# Altium footprint library PCB-Tester-Board-V1.PcbLib: 67 footprints (part 4 of 5)
Each footprint in its own frame and in the unit in brackets; x right, y up, seen from the top. Pads: shape width x height; smd on the part's side, far side on the other; paste and mask are expansions set on the pad; w line width, h text height; cw(c..) or ccw(c..) is an arc to the next point about the centre after c.
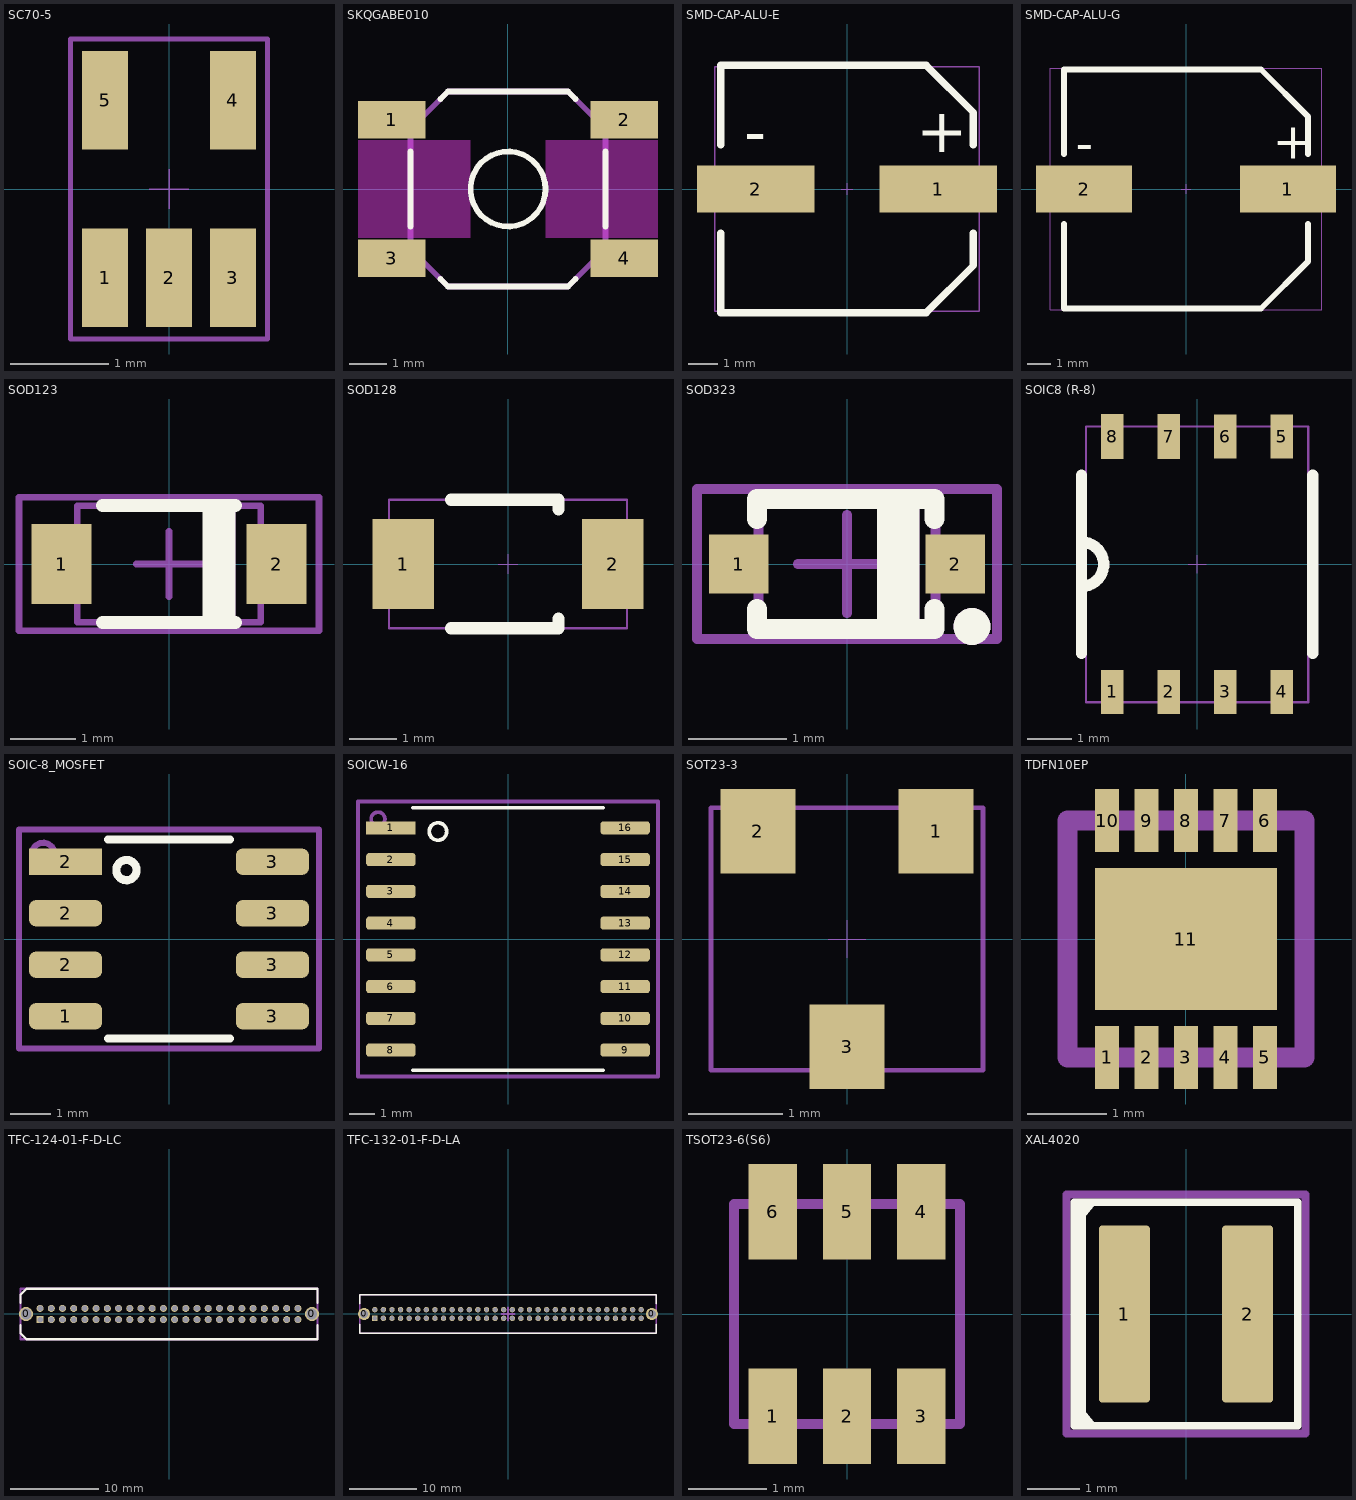
[diagram p3: the footprints below, top view; thin cyan lines are the x and y axes]

## SC70-5 [mm]
pads (5):
  rect 0.47x1 smd: 1(-0.65,-0.9) 2(0,-0.9) 3(0.65,-0.9) 4(0.65,0.9) 5(-0.65,0.9)
Top Courtyard:
  lines w0.05: -1,-1.524 1,-1.524 1,1.524 -1,1.524 -1,-1.524
Mechanical 17:
  lines w0.013: -0.2,0 0.2,0 ; 0,-0.2 0,0.2
3D body "SC70-5.step": height 0.95, standoff 0, extent -1,-1.05 1,1.05

## SKQGABE010 [mm] "5.2mm square low-profile TACT switch"
height 1.5
pads (4):
  rect 1.8x1 smd: 1(-3.1,1.85) 2(3.1,1.85) 3(-3.1,-1.85) 4(3.1,-1.85)
Top Layer keep-out:
  region: -1,1.3 -4,1.3 -4,-1.3 -1,-1.3
  rectangle: 1,-1.3 4,1.3
Top Overlay:
  circle w0.15: c0,0 r1
  lines w0.15: -2.6,-1 -2.6,1 ; -1.8,-2.4 -1.6,-2.6 1.6,-2.6 1.8,-2.4 ; -1.8,2.4 -1.6,2.6 1.6,2.6 1.8,2.4 ; 2.6,-1 2.6,1
Mechanical 15:
  lines w0.15: -2.6,-1.6 -1.6,-2.6 1.6,-2.6 2.6,-1.6 2.6,1.6 1.6,2.6 -1.6,2.6 -2.6,1.6 -2.6,-1.6
3D body: height 1.5, standoff 1.2, extent -0.992,-0.998 1,0.998
3D body: height 1.2, standoff 0, extent -2.6,-2.6 2.6,2.6
3D body: height 0.3, standoff 0, extent 2.1,1.6 3.2,2.1
3D body: height 0.3, standoff 0, extent -3.2,-2.1 -2.1,-1.6
3D body: height 0.3, standoff 0, extent 2.1,-2.1 3.2,-1.6
3D body: height 0.3, standoff 0, extent -3.2,1.6 -2.1,2.1

## SMD-CAP-ALU-E [mm] "Ř8.0mm x 6.2mm"
pads (2):
  rect 4x1.6 smd: 1(3.1,0) 2(-3.1,0)
Top Overlay:
  lines w0.254: -4.3,-1.5 -4.3,-4.2 2.7,-4.2 4.3,-2.6 4.3,-1.5 ; -4.3,1.5 -4.3,4.2 2.7,4.2 4.3,2.6 4.3,1.5
  text "+" at 2.35,1.25 h1.52
  text "-" at -3.5,1.2 h1.52
Top Courtyard:
  lines w0.05: -4.5,-4.15 4.5,-4.15 4.5,4.15 -4.5,4.15 -4.5,-4.15
Mechanical 17:
  lines w0.013: -0.2,0 0.2,0 ; 0,-0.2 0,0.2
3D body "SMD-CAP-ALU-E.STEP": height 6.2, standoff 0, extent -4.5,-4.15 4.5,4.15

## SMD-CAP-ALU-G [mm] "Ř10.0mm x 10.2mm"
pads (2):
  rect 4.1x2 smd: 1(4.35,0) 2(-4.35,0)
Top Overlay:
  lines w0.254: -5.2,-1.5 -5.2,-5.1 3.2,-5.1 5.2,-3.1 5.2,-1.5 ; -5.2,1.5 -5.2,5.1 3.2,5.1 5.2,3.1 5.2,1.5
  text "+" at 3.7,1.3 h1.52
  text "-" at -4.7,1.2 h1.52
Top Courtyard:
  lines w0.05: -5.8,-5.15 5.8,-5.15 5.8,5.15 -5.8,5.15 -5.8,-5.15
Mechanical 17:
  lines w0.013: -0.2,0 0.2,0 ; 0,-0.2 0,0.2
3D body "SMD-CAP-ALU-G.STEP": height 10.2, standoff 0, extent -5.8,-5.15 5.8,5.15

## SOD123 [mil]
pads (2):
  rect 35.98x47.99 smd: 1(-64.5,0) 2(64.5,0)
Top Overlay:
  rectangle: 20,-35 40,35
  lines w7.87: -40,-35 40,-35 ; -40,35 40,35
Mechanical 13:
  rectangle: 25,-35 40,35
  lines w3.94: -55,-35 55,-35 55,35 -55,35 -55,-35
Mechanical 15:
  lines w3.94: -19.68,0 19.68,0 ; 0,-19.68 0,19.68 ; -90,-40 90,-40 90,40 -90,40 -90,-40
3D body: height 47.24, standoff 0, extent -55,-35 55,35

## SOD128 [mm] "PMEG4050EP,115"
pads (2):
  rect 1.3x1.9 smd: 1(-2.2,0) 2(2.2,0)
Top Overlay:
  lines w0.254: -1.2,-1.35 1.06,-1.35 1.06,-1.15 ; -1.2,1.35 1.06,1.35 1.06,1.15
Top Courtyard:
  lines w0.05: -2.5,-1.35 -2.5,1.35 2.5,1.35 2.5,-1.35 -2.5,-1.35
Mechanical 17:
  lines w0.013: -0.2,0 0.2,0 ; 0,-0.2 0,0.2
3D body "Schottky_Diode_SOD128.step": height 1.1, standoff -0.01, extent -2.5,-1.35 2.5,1.35

## SOD323 [mm]
pads (2):
  rect 0.6x0.6 smd: 1(-1.1,0) 2(1.1,0)
Top Overlay:
  circle w0.254: c1.27,-0.635 r0.06
  rectangle: 0.305,-0.635 0.737,0.726
  lines w0.2: -0.914,-0.457 -0.914,-0.66 0.889,-0.66 0.889,-0.457 ; -0.914,0.457 -0.914,0.66 0.889,0.66 0.889,0.457
Mechanical 13:
  circle w0.254: c1.27,-0.635 r0.06
  rectangle: 0.305,-0.686 0.737,0.675
  lines w0.1: -0.9,-0.229 -1.321,-0.229 -1.321,0.229 -0.9,0.229 ; 0.9,-0.229 1.321,-0.229 1.321,0.229 0.9,0.229 ; -0.9,-0.675 -0.9,0.675 0.9,0.675 0.9,-0.675 -0.9,-0.675
Mechanical 15:
  lines w0.1: -0.5,0 0.5,0 ; 0,-0.5 0,0.5 ; -1.524,-0.762 1.524,-0.762 1.524,0.762 -1.524,0.762 -1.524,-0.762
3D body: height 1.1, standoff 0, extent -0.9,-0.675 0.9,0.675

## SOIC8 (R-8) [mil] "Generic 8 lead SOIC Narrow Body"
height 69
pads (8):
  rect 20x39 smd: 1(-75,-113) 2(-25,-113) 3(25,-113) 4(75,-113) 5(75,113) 6(25,113)
  rect 20x40 smd: 7(-25,113) 8(-75,113)
Top Overlay:
  lines w10: -102.36,-78.74 -102.36,78.74 ; -102.36,-19.68 ccw(c-102.36,0) -102.36,19.68 ; 102.36,-78.74 102.36,78.74
Top Courtyard:
  lines w1.97: -98.42,-122.04 98.43,-122.04 98.43,122.06 -98.42,122.06 -98.42,-122.04
Mechanical 17:
  lines w0.51: -7.87,0 7.87,0 ; 0,-7.87 0,7.87
3D body "SOIC8N.step": height 68.9, standoff 0, extent -98.42,-122.04 98.43,122.06

## SOIC-8_MOSFET [mm] "8 lead SOIC with pin numbering for MOSFET"
height 1.75
pads (8):
  rrect50% 1.8x0.65 smd paste+0 mask+0.05: 1(-2.55,-1.905) 2(-2.55,-0.635) 2(-2.55,0.635) 3(2.55,-1.905) 3(2.55,-0.635) 3(2.55,0.635) 3(2.55,1.905)
  rect 1.8x0.65 smd paste+0 mask+0.05: 2(-2.55,1.905)
Top Overlay:
  circle w0.2: c-1.05,1.7 r0.25
  lines w0.2: -1.5,-2.45 1.5,-2.45 ; -1.5,2.45 1.5,2.45
Mechanical 15:
  circle w0.15: c-3.1,2.1 r0.275
  lines w0.15: -3.7,-2.7 3.7,-2.7 3.7,2.7 -3.7,2.7 -3.7,-2.7
3D body: height 1.75, standoff 1.75, extent -1.418,1.481 -0.9,2
3D body: height 0.15, standoff 0, extent -3,1.695 -2.65,2.115
3D body: height 0.15, standoff 0, extent -3,0.425 -2.65,0.845
3D body: height 0.15, standoff 0, extent -3,-0.845 -2.65,-0.425
3D body: height 0.15, standoff 0, extent -3,-2.115 -2.65,-1.695
3D body: height 0.15, standoff 0, extent 2.65,1.695 3,2.115
3D body: height 0.15, standoff 0, extent 2.65,0.425 3,0.845
3D body: height 0.15, standoff 0, extent 2.65,-0.845 3,-0.425
3D body: height 0.15, standoff 0, extent 2.65,-2.115 3,-1.695
3D body: height 1.75, standoff 0, extent -1.95,-2.45 1.95,2.45
3D body: height 0.87, standoff 0, extent -2.65,-0.845 -1.95,-0.425
3D body: height 0.87, standoff 0, extent -2.65,0.425 -1.95,0.845
3D body: height 0.87, standoff 0, extent -2.65,1.695 -1.95,2.115
3D body: height 0.87, standoff 0, extent -2.65,-2.115 -1.95,-1.695
3D body: height 0.87, standoff 0, extent 1.95,-2.115 2.65,-1.695
3D body: height 0.87, standoff 0, extent 1.95,-0.845 2.65,-0.425
3D body: height 0.87, standoff 0, extent 1.95,0.425 2.65,0.845
3D body: height 0.87, standoff 0, extent 1.95,1.695 2.65,2.115

## SOICW-16 [mm] "16-lead wide SOIC package"
height 2.65
pads (16):
  rect 1.98x0.53 smd: 1(-4.685,4.445)
  rrect50% 1.98x0.53 smd: 2(-4.685,3.175) 3(-4.685,1.905) 4(-4.685,0.635) 5(-4.685,-0.635) 6(-4.685,-1.905) 7(-4.685,-3.175) 8(-4.685,-4.445) 9(4.685,-4.445) 10(4.685,-3.175) 11(4.685,-1.905) 12(4.685,-0.635) 13(4.685,0.635) 14(4.685,1.905) 15(4.685,3.175) 16(4.685,4.445)
Top Overlay:
  circle w0.15: c-2.8,4.3 r0.35
  lines w0.15: -3.8,-5.25 3.8,-5.25 ; -3.8,5.25 3.8,5.25
Mechanical 15:
  circle w0.15: c-5.2,4.8 r0.275
  lines w0.15: -6,-5.5 6,-5.5 6,5.5 -6,5.5 -6,-5.5
3D body: height 1.45, standoff 1.2, extent -4.275,-4.645 -3.8,-4.245
3D body: height 1.45, standoff 0, extent -4.525,-4.645 -4.275,-4.245
3D body: height 0.25, standoff 0, extent -5.325,-4.645 -4.525,-4.245
3D body: height 0.25, standoff 0, extent 4.525,-4.645 5.325,-4.245
3D body: height 1.45, standoff 0, extent 4.275,-4.645 4.525,-4.245
3D body: height 1.45, standoff 1.2, extent 3.8,-4.645 4.275,-4.245
3D body: height 1.45, standoff 1.2, extent -4.275,-3.375 -3.8,-2.975
3D body: height 1.45, standoff 0, extent -4.525,-3.375 -4.275,-2.975
3D body: height 0.25, standoff 0, extent -5.325,-3.375 -4.525,-2.975
3D body: height 0.25, standoff 0, extent 4.525,-3.375 5.325,-2.975
3D body: height 1.45, standoff 0, extent 4.275,-3.375 4.525,-2.975
3D body: height 1.45, standoff 1.2, extent 3.8,-3.375 4.275,-2.975
3D body: height 1.45, standoff 1.2, extent -4.275,-2.105 -3.8,-1.705
3D body: height 1.45, standoff 0, extent -4.525,-2.105 -4.275,-1.705
3D body: height 0.25, standoff 0, extent -5.325,-2.105 -4.525,-1.705
3D body: height 0.25, standoff 0, extent 4.525,-2.105 5.325,-1.705
3D body: height 1.45, standoff 0, extent 4.275,-2.105 4.525,-1.705
3D body: height 1.45, standoff 1.2, extent 3.8,-2.105 4.275,-1.705
3D body: height 1.45, standoff 1.2, extent -4.275,-0.835 -3.8,-0.435
3D body: height 1.45, standoff 0, extent -4.525,-0.835 -4.275,-0.435
3D body: height 0.25, standoff 0, extent -5.325,-0.835 -4.525,-0.435
3D body: height 0.25, standoff 0, extent 4.525,-0.835 5.325,-0.435
3D body: height 1.45, standoff 0, extent 4.275,-0.835 4.525,-0.435
3D body: height 1.45, standoff 1.2, extent 3.8,-0.835 4.275,-0.435
3D body: height 1.45, standoff 1.2, extent -4.275,0.435 -3.8,0.835
3D body: height 1.45, standoff 0, extent -4.525,0.435 -4.275,0.835
3D body: height 0.25, standoff 0, extent -5.325,0.435 -4.525,0.835
3D body: height 0.25, standoff 0, extent 4.525,0.435 5.325,0.835
3D body: height 1.45, standoff 0, extent 4.275,0.435 4.525,0.835
3D body: height 1.45, standoff 1.2, extent 3.8,0.435 4.275,0.835
3D body: height 1.45, standoff 1.2, extent -4.275,1.705 -3.8,2.105
3D body: height 1.45, standoff 0, extent -4.525,1.705 -4.275,2.105
3D body: height 0.25, standoff 0, extent -5.325,1.705 -4.525,2.105
3D body: height 0.25, standoff 0, extent 4.525,1.705 5.325,2.105
3D body: height 1.45, standoff 0, extent 4.275,1.705 4.525,2.105
3D body: height 1.45, standoff 1.2, extent 3.8,1.705 4.275,2.105
3D body: height 1.45, standoff 1.2, extent -4.275,2.975 -3.8,3.375
3D body: height 1.45, standoff 0, extent -4.525,2.975 -4.275,3.375
3D body: height 0.25, standoff 0, extent -5.325,2.975 -4.525,3.375
3D body: height 0.25, standoff 0, extent 4.525,2.975 5.325,3.375
3D body: height 1.45, standoff 0, extent 4.275,2.975 4.525,3.375
3D body: height 1.45, standoff 1.2, extent 3.8,2.975 4.275,3.375
3D body: height 1.45, standoff 1.2, extent -4.275,4.245 -3.8,4.645
3D body: height 1.45, standoff 0, extent -4.525,4.245 -4.275,4.645
3D body: height 0.25, standoff 0, extent -5.325,4.245 -4.525,4.645
3D body: height 0.25, standoff 0, extent 4.525,4.245 5.325,4.645
3D body: height 1.45, standoff 0, extent 4.275,4.245 4.525,4.645
3D body: height 1.45, standoff 1.2, extent 3.8,4.245 4.275,4.645
3D body: height 2.65, standoff 0, extent -3.8,-5.25 3.8,5.25
3D body: height 2.66, standoff 2.65, extent -3.298,3.809 -2.3,4.805

## SOT23-3 [mm]
pads (3):
  rect 0.8x0.9 smd mask+0.1: 1(0.95,1.15) 2(-0.95,1.15) 3(0,-1.15)
Top Courtyard:
  lines w0.05: -1.45,-1.4 -1.45,1.4 1.45,1.4 1.45,-1.4 -1.45,-1.4
Mechanical 17:
  lines w0.013: -0.2,0 0.2,0 ; 0,-0.2 0,0.2
3D body "SOT23-3.step": height 1.3, standoff 0, extent -1.45,-1.4 1.45,1.4

## TDFN10EP [mm] "Microchip TDFN 10 pins, exposed pad"
pads (11):
  rect 0.3x0.8 smd: 1(-1,-1.5) 2(-0.5,-1.5) 3(0,-1.5) 4(0.5,-1.5) 5(1,-1.5) 6(1,1.5) 7(0.5,1.5) 8(0,1.5) 9(-0.5,1.5) 10(-1,1.5)
  rect 2.3x1.8 smd: 11(0,0)
Top Overlay:
  text "." at -1.5,-1.5 h1
Top Courtyard:
  lines w0.254: -1.5,-1.501 -1.5,1.501 1.5,1.501 1.5,-1.501 -1.5,-1.501
3D body "TDFN10EP.STEP": height 0.75, standoff 0, extent -1.5,-1.501 1.5,1.501

## TFC-124-01-F-D-LC [mm] "48 pin box header straight"
pads (50):
  round 1.6 hole 1.19 unplated: 0(-16.192,0) 0(16.192,0)
  rect 0.8x0.8 hole 0.635 paste+0: 1(-14.605,-0.635)
  round 0.8 hole 0.635 paste+0: 2(-14.605,0.635) 3(-13.335,-0.635) 4(-13.335,0.635) 5(-12.065,-0.635) 6(-12.065,0.635) 7(-10.795,-0.635) 8(-10.795,0.635) 9(-9.525,-0.635) 10(-9.525,0.635) 11(-8.255,-0.635) 12(-8.255,0.635) 13(-6.985,-0.635) 14(-6.985,0.635) 15(-5.715,-0.635) 16(-5.715,0.635) 17(-4.445,-0.635) 18(-4.445,0.635) 19(-3.175,-0.635) 20(-3.175,0.635) 21(-1.905,-0.635) 22(-1.905,0.635) 23(-0.635,-0.635) 24(-0.635,0.635) 25(0.635,-0.635) 26(0.635,0.635) 27(1.905,-0.635) 28(1.905,0.635) 29(3.175,-0.635) 30(3.175,0.635) 31(4.445,-0.635) 32(4.445,0.635) 33(5.715,-0.635) 34(5.715,0.635) 35(6.985,-0.635) 36(6.985,0.635) 37(8.255,-0.635) 38(8.255,0.635) 39(9.525,-0.635) 40(9.525,0.635) 41(10.795,-0.635) 42(10.795,0.635) 43(12.065,-0.635) 44(12.065,0.635) 45(13.335,-0.635) 46(13.335,0.635) 47(14.605,-0.635) 48(14.605,0.635)
Top Overlay:
  lines w0.254: -16.828,-1.27 -16.828,-2.173 -16.143,-2.858 16.827,-2.858 16.827,-1.27 ; -16.828,1.27 -16.828,2.172 -16.143,2.857 16.827,2.857 16.827,1.27
Top Courtyard:
  lines w0.254: -16.828,-2.858 -16.828,2.857 16.827,2.857 16.827,-2.858 -16.828,-2.858
3D body "TFC-124-01-F-D-LC.STEP": height 5.59, standoff -1.98, extent -16.828,-2.858 16.827,2.857

## TFC-132-01-F-D-LA [mm] "64 pin box header right angled"
pads (66):
  round 1.778 hole 1.19 unplated paste-1.19: 0(-21.275,0) 0(21.275,0)
  rect 0.8x0.8 hole 0.635 paste+0: 1(-19.685,-0.635)
  round 0.8 hole 0.635 paste+0: 2(-19.685,0.635) 3(-18.415,-0.635) 4(-18.415,0.635) 5(-17.145,-0.635) 6(-17.145,0.635) 7(-15.875,-0.635) 8(-15.875,0.635) 9(-14.605,-0.635) 10(-14.605,0.635) 11(-13.335,-0.635) 12(-13.335,0.635) 13(-12.065,-0.635) 14(-12.065,0.635) 15(-10.795,-0.635) 16(-10.795,0.635) 17(-9.525,-0.635) 18(-9.525,0.635) 19(-8.255,-0.635) 20(-8.255,0.635) 21(-6.985,-0.635) 22(-6.985,0.635) 23(-5.715,-0.635) 24(-5.715,0.635) 25(-4.445,-0.635) 26(-4.445,0.635) 27(-3.175,-0.635) 28(-3.175,0.635) 29(-1.905,-0.635) 30(-1.905,0.635) 31(-0.635,-0.635) 32(-0.635,0.635) 33(0.635,-0.635) 34(0.635,0.635) 35(1.905,-0.635) 36(1.905,0.635) 37(3.175,-0.635) 38(3.175,0.635) 39(4.445,-0.635) 40(4.445,0.635) 41(5.715,-0.635) 42(5.715,0.635) 43(6.985,-0.635) 44(6.985,0.635) 45(8.255,-0.635) 46(8.255,0.635) 47(9.525,-0.635) 48(9.525,0.635)
  round 0.8 hole 0.635 paste-1: 49(10.795,-0.635) 50(10.795,0.635) 51(12.065,-0.635) 52(12.065,0.635) 53(13.335,-0.635) 54(13.335,0.635) 55(14.605,-0.635) 56(14.605,0.635) 57(15.875,-0.635) 58(15.875,0.635) 59(17.145,-0.635) 60(17.145,0.635) 61(18.415,-0.635) 62(18.415,0.635) 63(19.685,-0.635) 64(19.685,0.635)
Top Overlay:
  lines w0.254: -21.908,-1.5 -21.908,-2.858 21.907,-2.858 21.907,-1.5 ; -21.908,1.5 -21.908,2.857 21.907,2.857 21.907,1.5
Top Courtyard:
  lines w0.254: -21.908,-2.858 21.907,-2.858 21.907,2.857 -21.908,2.857 -21.908,-2.858
Mechanical 17:
  lines w0.254: -1,0 1,0 ; 0,-1 0,1
3D body "TFC-132-01-F-D-LC.STEP": height 5.59, standoff -1.98, extent -21.908,-2.858 21.907,2.857

## TSOT23-6(S6) [mm] "6-Lead Plastic TSOT-23"
pads (6):
  rect 0.62x1.225 smd: 1(-0.95,-1.31) 2(0,-1.31) 3(0.95,-1.31) 4(0.95,1.31) 5(0,1.31) 6(-0.95,1.31)
Top Overlay:
  text "." at -1.8,-1.5 h1
Top Courtyard:
  lines w0.127: -1.45,-1.412 -1.45,1.412 1.45,1.412 1.45,-1.412 -1.45,-1.412
3D body "TSOT-23-6(S6).STEP": height 1, standoff 0, extent -1.45,-1.412 1.45,1.412

## XAL4020 [mm] "Shielded Power Inductor"
height 2.1
pads (2):
  rrect12% 0.98x3.4 smd: 1(-1.185,0) 2(1.185,0)
Top Overlay:
  lines w0.15: -2,-2.15 -2,2.15 ; -2,-1.9 -1.8,-2.15 ; -2,1.9 -1.8,2.15 ; -2.15,-2.15 2.15,-2.15 2.15,2.15 -2.15,2.15 -2.15,-2.15
Mechanical 15:
  lines w0.15: -2.3,-2.3 -2.3,2.3 2.3,2.3 2.3,-2.3 -2.3,-2.3
3D body: height 2.1, standoff 2.1, extent -1.7,-1.7 -1.4,1.7
3D body: height 2.1, standoff 0, extent -2.15,-2.15 2.15,2.15